# Altium footprint library USB to RS232.PcbLib: 20 footprints (part 2 of 2)
Each footprint in its own frame and in the unit in brackets; x right, y up, seen from the top. Pads: shape width x height; smd on the part's side, far side on the other; paste and mask are expansions set on the pad; w line width, h text height; cw(c..) or ccw(c..) is an arc to the next point about the centre after c.
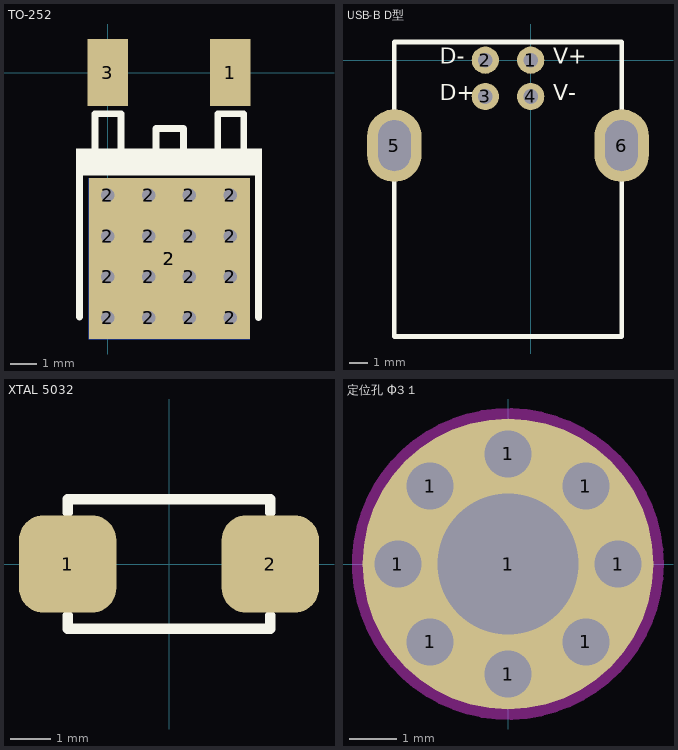
[diagram p1: the footprints below, top view; thin cyan lines are the x and y axes]

## TO-252 [mm]
height 2
pads (20):
  rect 1.5x2.5 smd: 1(4.572,0) 3(0,0)
  round 1 hole 0.5: 2(0,-9.144) 2(0,-7.62) 2(0,-6.096) 2(0,-4.572) 2(1.524,-9.144) 2(1.524,-7.62) 2(1.524,-6.096) 2(1.524,-4.572) 2(3.048,-9.144) 2(3.048,-7.62) 2(3.048,-6.096) 2(3.048,-4.572) 2(4.572,-9.144) 2(4.572,-7.62) 2(4.572,-6.096) 2(4.572,-4.572)
  rect 6x6 smd: 2(2.3,-6.933)
  rect 6x6 smd far side: 2(2.3,-6.933)
Top Overlay:
  region: 5.75,-2.832 -1.175,-2.832 -1.175,-3.832 5.75,-3.832
  lines w0.254: -1.05,-9.108 -1.05,-3.683 ; -0.475,-2.808 -0.475,-1.533 ; 0.5,-2.783 0.5,-1.533 -0.475,-1.533 ; 1.8,-2.883 1.8,-2.083 2.825,-2.083 2.825,-2.783 ; 4.1,-2.808 4.1,-1.533 5.075,-1.533 5.075,-2.783 ; 5.625,-9.133 5.625,-3.658 ; -0.475,-1.533 -0.475,-1.533
3D body "TO-252.step": height 2.3, standoff 0, extent -1.004,-9.561 5.576,0.139

## USB-B D型 [mm]
height 5.08
pads (6):
  round 1.5 hole 0.8: 1(0,0) 2(-2.5,0) 3(-2.5,-2) 4(0,-2)
  oval 3x4 hole 1.8 slot 2.8 at 90 deg: 5(-7.5,-4.7) 6(5,-4.7)
Top Overlay:
  lines w0.254: 5,-4.954 5,-4.446 ; -7.5,-15.2 -7.5,1 5,1 5,-15.2 -7.5,-15.2
  text "D-" at -5,-0.5 h1.52
  text "D+" at -5,-2.5 h1.52
  text "V-" at 1.25,-2.5 h1.52
  text "V+" at 1.25,-0.5 h1.52
3D body "USB 母 D型.STEP": height 11, standoff -3.64, extent -8.649,-14.95 6.147,1.55

## XTAL 5032 [mm] "贴片 SMD 5032 无源晶振"
height 1.3
pads (2):
  rrect50% 2.4x2.4 smd: 1(-2.5,0) 2(2.5,0)
Top Overlay:
  lines w0.254: -2.5,-1.27 -2.5,-1.6 2.5,-1.6 2.5,-1.27 ; -2.5,1.27 -2.5,1.6 2.5,1.6 2.5,1.27
3D body "5032.STEP": height 1.35, standoff 0, extent -2.5,-1.6 2.5,1.6

## 定位孔 Φ3 1 [mm]
pads (9):
  round 1 hole 1: 1(-2.35,0) 1(-1.662,-1.662) 1(-1.662,1.662) 1(0,-2.35) 1(0,2.35) 1(1.662,-1.662) 1(1.662,1.662) 1(2.35,0)
  round 6.2 hole 3: 1(0,0)
Keep-Out Layer:
  circle w0.254: c0,0 r3.2